# Altium footprint library BMS_V2.1_Adv.PcbLib: 66 footprints (part 3 of 5)
Each footprint in its own frame and in the unit in brackets; x right, y up, seen from the top. Pads: shape width x height; smd on the part's side, far side on the other; paste and mask are expansions set on the pad; w line width, h text height; cw(c..) or ccw(c..) is an arc to the next point about the centre after c.
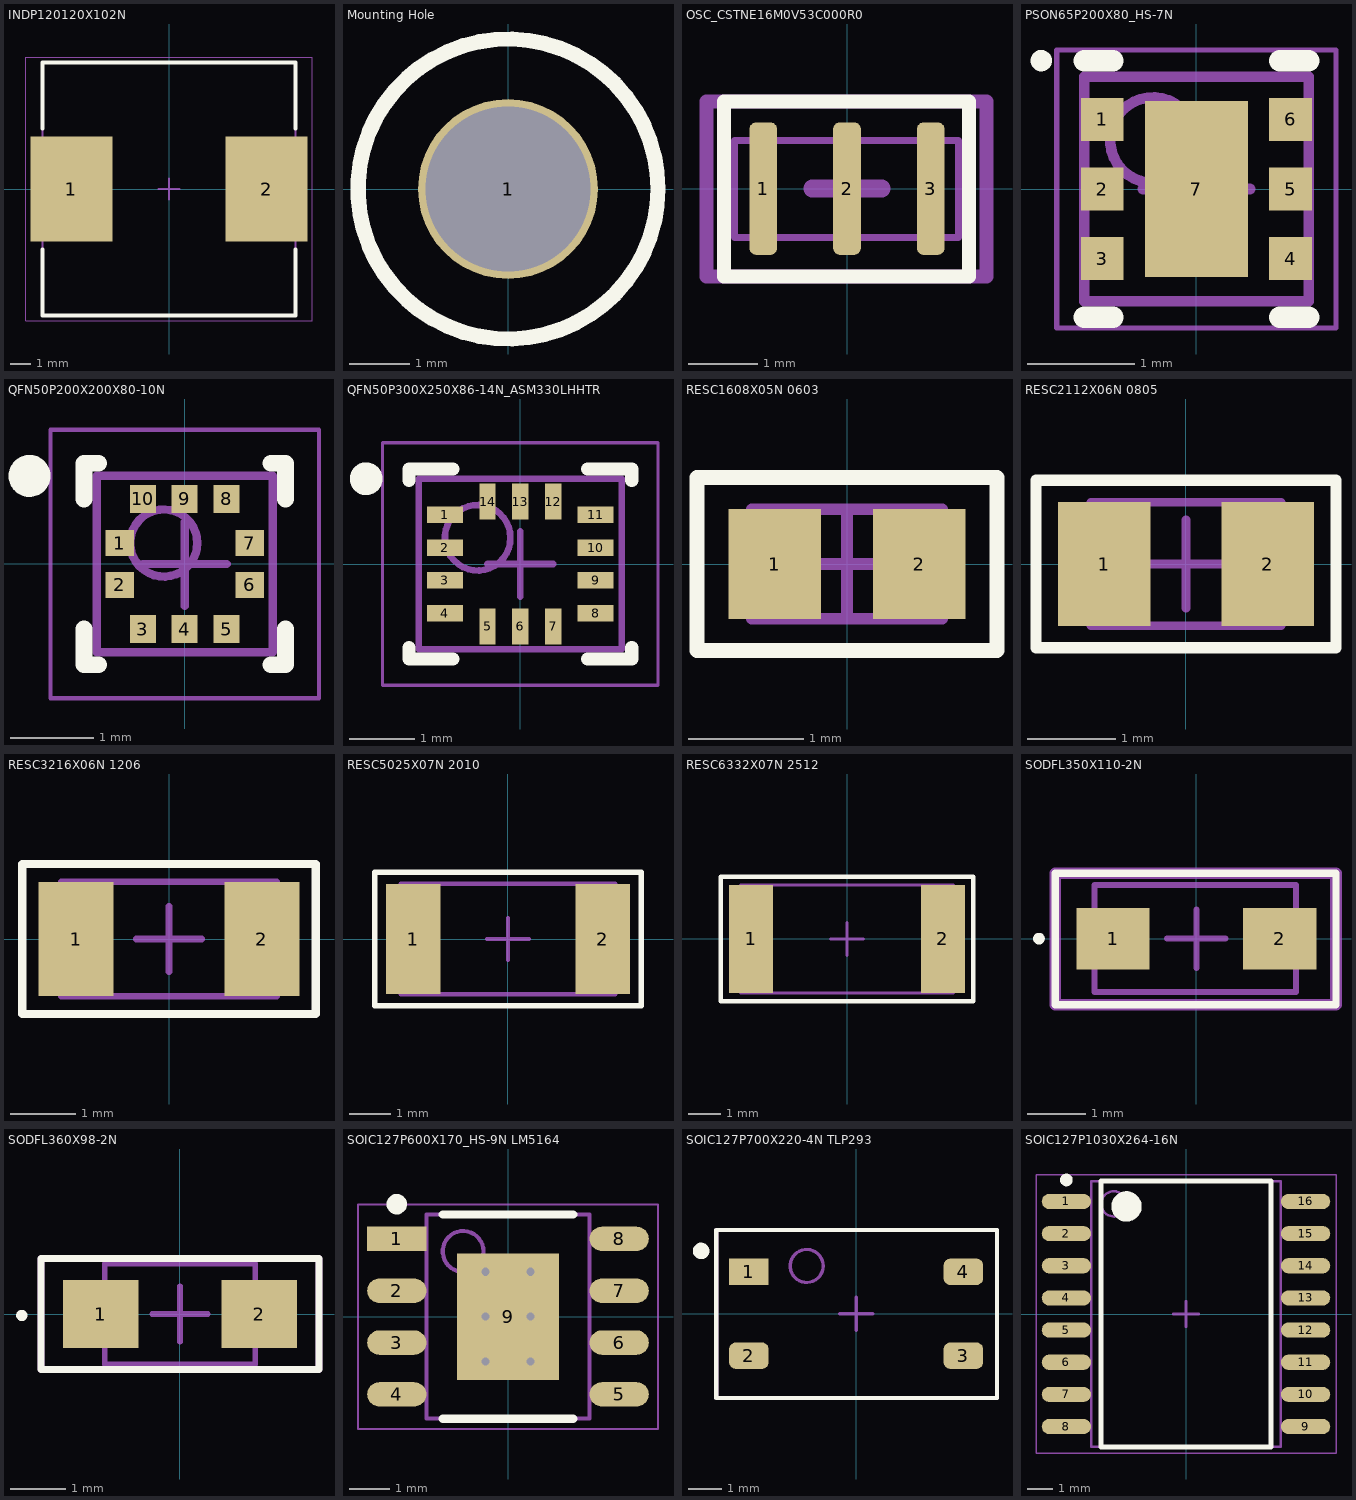
[diagram p2: the footprints below, top view; thin cyan lines are the x and y axes]

## INDP120120X102N [mm] "Precision Wire Wound Inductor, 2-Leads, Body 12.00x12.00mm, IPC Medium Density"
height 10.2
pads (2):
  rect 4x5.1 smd: 1(-4.75,0) 2(4.75,0)
Top Overlay:
  lines w0.2: -6.15,-2.95 -6.15,-6.15 6.15,-6.15 6.15,-2.95 ; -6.15,2.95 -6.15,6.15 6.15,6.15 6.15,2.95
Mechanical 13:
  lines w0.1: -6.15,-6.15 -6.15,6.15 6.15,6.15 6.15,-6.15 -6.15,-6.15
  text ".Designator" at -3.302,-0.254 h0.69
Mechanical 15:
  lines w0.05: -6.975,-6.4 -6.975,6.4 6.975,6.4 6.975,-6.4 -6.975,-6.4
  lines w0.1: -0.5,0 0.5,0 ; 0,-0.5 0,0.5
3D body "IND_MSS1210_COC.step": height 10.21, standoff 0, extent -6.147,-6.147 6.147,6.147

## Mounting Hole [mm] "Mounting Hole  M6"
pads (1):
  round 3 hole 2.75: 1(0,0)
Top Overlay:
  circle w0.254: c0,0 r2.5
Mechanical 13:
  text ".Designator" at -3.302,3.023 h0.69
Mechanical 15:
  lines w0.254: -0.5,0 0.5,0 ; 0,-0.5 0,0.5
3D body "MBScrew_Threaded.step": height 6.38, standoff 0.01, extent -3.4,-3.397 3.4,3.397
3D body "Standoff_M3_14mm.step": height 20.01, standoff 0.01, extent -2.35,-2.714 2.35,2.714

## OSC_CSTNE16M0V53C000R0 [mm] "CSTNE16M0V53C000R0"
height 1
pads (3):
  rrect50% 0.4x1.9 smd: 1(-1.2,0) 2(0,0) 3(1.2,0)
Top Overlay:
  lines w0.203: -1.763,-1.263 1.75,-1.263 1.75,1.25 -1.763,1.25 -1.763,-1.263
Mechanical 13:
  lines w0.1: -1.613,-0.699 1.6,-0.699 1.6,0.686 -1.613,0.686 -1.613,-0.699
  text ".Designator" at -1.27,0.102 h0.69
Mechanical 15:
  lines w0.203: -2.013,-1.263 2,-1.263 2,1.25 -2.013,1.25 -2.013,-1.263
  lines w0.254: -0.5,0 0.5,0 ; 0,-0.5 0,0.5
3D body "CSTNE16M0V53C000R0.step": height 1.01, standoff 0.01, extent -1.6,-0.65 1.6,0.65

## PSON65P200X80_HS-7N [mm] "PSON, 6-Leads, Body 2.00x2.00mm, Pitch 0.65mm, Thermal Pad 1.65x0.96mm, IPC Medium Density"
height 0.8
pads (7):
  rect 0.4x0.4 smd: 1(-0.88,0.65) 2(-0.88,0) 3(-0.88,-0.65) 4(0.88,-0.65) 5(0.88,0) 6(0.88,0.65)
  rect 0.96x1.65 smd: 7(0,0)
Top Overlay:
  circle w0.1: c-1.45,1.2 r0.05
  lines w0.2: -1.05,-1.2 -0.78,-1.2 ; -1.05,1.2 -0.78,1.2 ; 0.78,-1.2 1.05,-1.2 ; 0.78,1.2 1.05,1.2
Mechanical 13:
  circle w0.1: c-0.406,0.457 r0.4
  lines w0.1: -1.05,-1.05 1.05,-1.05 1.05,1.05 -1.05,1.05 -1.05,-1.05
  text ".Designator" at -0.508,-0.025 h0.69
Mechanical 15:
  lines w0.05: -1.305,-1.3 1.305,-1.3 1.305,1.3 -1.305,1.3 -1.305,-1.3
  lines w0.1: -0.5,0 0.5,0 ; 0,-0.5 0,0.5
3D body "TPS7A2633DRVR.step": height 0.81, standoff 0.01, extent -1,-1 1,1

## QFN50P200X200X80-10N [mm] "QFN, 10-Leads, Body 2.00x2.00mm, Pitch 0.50mm, IPC Medium Density"
height 0.8
pads (10):
  rect 0.335x0.31 smd: 1(-0.775,0.25) 2(-0.775,-0.25) 6(0.775,-0.25) 7(0.775,0.25)
  rect 0.31x0.335 smd: 3(-0.5,-0.775) 4(0,-0.775) 5(0.5,-0.775) 8(0.5,0.775) 9(0,0.775) 10(-0.5,0.775)
Top Overlay:
  circle w0.25: c-1.85,1.05 r0.125
  lines w0.2: -1.2,-0.775 -1.2,-1.2 -1.025,-1.2 ; -1.2,0.775 -1.2,1.2 -1.025,1.2 ; 1.025,-1.2 1.2,-1.2 1.2,-0.775 ; 1.025,1.2 1.2,1.2 1.2,0.775
Mechanical 13:
  circle w0.1: c-0.25,0.25 r0.4
  lines w0.1: -1.05,-1.05 -1.05,1.05 1.05,1.05 1.05,-1.05 -1.05,-1.05
Mechanical 15:
  lines w0.05: -1.6,-1.6 -1.6,1.6 1.6,1.6 1.6,-1.6 -1.6,-1.6
  lines w0.1: -0.5,0 0.5,0 ; 0,-0.5 0,0.5
3D body "HLGA_10L_STM.step": height 0.81, standoff 0, extent -1.054,-1.054 1.054,1.054

## QFN50P300X250X86-14N_ASM330LHHTR [mm] "QFN, 14-Leads, Body 3.00x2.50mm, Pitch 0.50mm, IPC Medium Density"
height 0.86
pads (14):
  rect 0.55x0.25 smd: 1(-1.15,0.75) 2(-1.15,0.25) 3(-1.15,-0.25) 4(-1.15,-0.75) 8(1.15,-0.75) 9(1.15,-0.25) 10(1.15,0.25) 11(1.15,0.75)
  rect 0.25x0.55 smd: 5(-0.5,-0.95) 6(0,-0.95) 7(0.5,-0.95) 12(0.5,0.95) 13(0,0.95) 14(-0.5,0.95)
Top Overlay:
  circle w0.25: c-2.35,1.3 r0.125
  lines w0.2: -1.7,-1.275 -1.7,-1.45 -1.025,-1.45 ; -1.7,1.275 -1.7,1.45 -1.025,1.45 ; 1.025,-1.45 1.7,-1.45 1.7,-1.275 ; 1.025,1.45 1.7,1.45 1.7,1.275
Mechanical 13:
  circle w0.1: c-0.65,0.4 r0.5
  lines w0.1: -1.55,-1.3 1.55,-1.3 1.55,1.3 -1.55,1.3 -1.55,-1.3
Mechanical 15:
  lines w0.05: -2.1,-1.85 2.1,-1.85 2.1,1.85 -2.1,1.85 -2.1,-1.85
  lines w0.1: -0.5,0 0.5,0 ; 0,-0.5 0,0.5
3D body "ASM330LHHTR.step": height 0.87, standoff 0.01, extent -1.5,-1.25 1.5,1.25

## RESC1608X05N 0603 [mm] "Chip Resistor, 2-Leads, Body 1.55x0.85mm, IPC Medium Density"
height 0.5
pads (2):
  rect 0.8x0.95 smd: 1(-0.625,0) 2(0.625,0)
Top Overlay:
  lines w0.127: -1.3,-0.75 1.3,-0.75 1.3,0.75 -1.3,0.75 -1.3,-0.75
Mechanical 13:
  lines w0.1: -0.825,-0.475 0.825,-0.475 0.825,0.475 -0.825,0.475 -0.825,-0.475
  text ".Designator" at -0.825,-0.475 h0.69
Mechanical 15:
  lines w0.05: -1.3,-0.75 -1.3,0.75 1.3,0.75 1.3,-0.75 -1.3,-0.75
  lines w0.1: -0.475,0 0.475,0 ; 0,-0.475 0,0.475
3D body "RESC1508X05N 0603.step": height 0.5, standoff 0, extent -0.825,-0.475 0.825,0.475

## RESC2112X06N 0805 [mm] "Chip Resistor, 2-Leads, Body 2.08x1.25mm, IPC Medium Density"
height 0.65
pads (2):
  rect 1.05x1.4 smd: 1(-0.925,0) 2(0.925,0)
Top Overlay:
  lines w0.127: -1.7,-0.95 1.7,-0.95 1.7,0.95 -1.7,0.95 -1.7,-0.95
Mechanical 13:
  lines w0.1: -1.075,-0.7 1.075,-0.7 1.075,0.7 -1.075,0.7 -1.075,-0.7
  text ".Designator" at -1.143,-0.508 h0.69
Mechanical 15:
  lines w0.05: -1.7,-0.95 -1.7,0.95 1.7,0.95 1.7,-0.95 -1.7,-0.95
  lines w0.1: -0.5,0 0.5,0 ; 0,-0.5 0,0.5
3D body "RES 0805.stp": height 0.55, standoff 0, extent -1,-0.635 1,0.615

## RESC3216X06N 1206 [mm] "Chip Resistor, 2-Leads, Body 3.15x1.60mm, IPC Medium Density"
height 0.6
pads (2):
  rect 1.15x1.75 smd: 1(-1.425,0) 2(1.425,0)
Top Overlay:
  lines w0.127: -2.25,-1.15 2.25,-1.15 2.25,1.15 -2.25,1.15 -2.25,-1.15
Mechanical 13:
  lines w0.1: -1.65,-0.875 1.65,-0.875 1.65,0.875 -1.65,0.875 -1.65,-0.875
  text ".Designator" at -1.397,-0.381 h0.69
Mechanical 15:
  lines w0.05: -2.25,-1.15 2.25,-1.15 2.25,1.15 -2.25,1.15 -2.25,-1.15
  lines w0.1: -0.5,0 0.5,0 ; 0,-0.5 0,0.5
3D body "RES 1206.step": height 0.61, standoff 0.01, extent -1.6,-0.8 1.6,0.8

## RESC5025X07N 2010 [mm] "Chip Resistor, 2-Leads, Body 5.00x2.50mm, IPC Medium Density"
height 0.7
pads (2):
  rect 1.3x2.65 smd: 1(-2.275,0) 2(2.275,0)
Top Overlay:
  lines w0.127: -3.2,-1.6 3.2,-1.6 3.2,1.6 -3.2,1.6 -3.2,-1.6
Mechanical 13:
  lines w0.1: -2.575,-1.325 -2.575,1.325 2.575,1.325 2.575,-1.325 -2.575,-1.325
  text ".Designator" at -1.778,-0.254 h0.69
Mechanical 15:
  lines w0.05: -3.2,-1.6 -3.2,1.6 3.2,1.6 3.2,-1.6 -3.2,-1.6
  lines w0.1: -0.5,0 0.5,0 ; 0,-0.5 0,0.5
3D body "RES 2010.step": height 0.71, standoff 0.01, extent -2.5,-1.25 2.5,1.25

## RESC6332X07N 2512 [mm] "Chip Resistor, 2-Leads, Body 6.30x3.15mm, IPC Medium Density"
height 0.7
pads (2):
  rect 1.35x3.3 smd: 1(-2.925,0) 2(2.925,0)
Top Overlay:
  lines w0.127: -3.85,-1.9 3.85,-1.9 3.85,1.9 -3.85,1.9 -3.85,-1.9
Mechanical 13:
  lines w0.1: -3.25,-1.65 -3.25,1.65 3.25,1.65 3.25,-1.65 -3.25,-1.65
  text ".Designator" at -2.032,-0.254 h0.69
Mechanical 15:
  lines w0.05: -3.85,-1.9 -3.85,1.9 3.85,1.9 3.85,-1.9 -3.85,-1.9
  lines w0.1: -0.5,0 0.5,0 ; 0,-0.5 0,0.5
3D body "RES 2512.step": height 0.71, standoff 0.01, extent -3.125,-1.575 3.175,1.575

## SODFL350X110-2N [mm] "SODFL, 2-Leads, Body 1.65x3.50mm, IPC Medium Density"
height 1.1
pads (2):
  rect 1.25x1.05 smd: 1(-1.425,0) 2(1.425,0)
Top Overlay:
  circle w0.1: c-2.692,0 r0.05
  lines w0.127: -2.413,-1.13 2.388,-1.13 2.388,1.118 -2.413,1.118 -2.413,-1.13
Mechanical 13:
  lines w0.1: -1.74,-0.914 1.702,-0.914 1.702,0.914 -1.74,0.914 -1.74,-0.914
  text ".Designator" at -1.397,-0.254 h0.69
Mechanical 15:
  lines w0.1: -0.5,0 0.5,0 ; 0,-0.5 0,0.5
  lines w0.203: -2.413,-1.13 2.388,-1.13 2.388,1.118 -2.413,1.118 -2.413,-1.13
3D body "SODFL350X110-2N.step": height 1.1, standoff 0, extent -1.75,-0.9 1.75,0.9

## SODFL360X98-2N [mm] "SODFL, 2-Leads, Body 1.65x3.60mm, IPC Medium Density"
height 0.98
pads (2):
  rect 1.35x1.22 smd: 1(-1.425,0) 2(1.425,0)
Top Overlay:
  circle w0.1: c-2.845,-0.025 r0.05
  lines w0.127: -2.5,-1 2.5,-1 2.5,1 -2.5,1 -2.5,-1
Mechanical 13:
  lines w0.1: -1.35,-0.9 1.35,-0.9 1.35,0.9 -1.35,0.9 -1.35,-0.9
  text ".Designator" at -1.422,-0.279 h0.69
Mechanical 15:
  lines w0.1: -0.5,0 0.5,0 ; 0,-0.5 0,0.5
  lines w0.127: -2.5,-1 2.5,-1 2.5,1 -2.5,1 -2.5,-1
3D body "SDO_SOD-123FL_498__OSI.step": height 1, standoff 0, extent -1.905,-0.889 1.905,0.915

## SOIC127P600X170_HS-9N LM5164 [mm] "SOIC, 8-Leads, Body 4.90x3.90mm, Pitch 1.27mm, Thermal Pad 3.10x2.50mm, IPC Medium Density"
height 1.7
pads (9):
  rect 1.45x0.6 smd: 1(-2.725,1.905)
  oval 1.45x0.6 smd: 2(-2.725,0.635) 3(-2.725,-0.635) 4(-2.725,-1.905) 5(2.725,-1.905) 6(2.725,-0.635) 7(2.725,0.635) 8(2.725,1.905)
  rect 2.5x3.1 smd: 9(0,0)
via 0.55,-1.1 diameter 0.5 hole 0.2
via -0.55,-1.1 diameter 0.5 hole 0.2
via 0.55,0 diameter 0.5 hole 0.2
via -0.55,0 diameter 0.5 hole 0.2
via 0.55,1.1 diameter 0.5 hole 0.2
via -0.55,1.1 diameter 0.5 hole 0.2
Top Overlay:
  circle w0.25: c-2.725,2.755 r0.125
  lines w0.2: -1.6,-2.5 1.6,-2.5 ; -1.6,2.5 1.6,2.5
Mechanical 13:
  circle w0.1: c-1.1,1.6 r0.5
  lines w0.1: -2,-2.5 2,-2.5 2,2.5 -2,2.5 -2,-2.5
  text ".Designator" at -1.524,-0.127 h0.69
Mechanical 15:
  lines w0.05: -3.675,-2.75 3.675,-2.75 3.675,2.75 -3.675,2.75 -3.675,-2.75
  lines w0.1: -0.5,0 0.5,0 ; 0,-0.5 0,0.5
3D body "LM5164DDAT.step": height 1.56, standoff -0.14, extent -3,-2.45 3,2.45

## SOIC127P700X220-4N TLP293 [mm] "SOIC, 4-Leads, Body 2.65x4.60mm, Pitch 1.27mm, IPC Medium Density"
height 2.2
pads (4):
  rect 1.2x0.8 smd: 1(-3.25,1.27)
  rrect50% 1.2x0.8 smd: 2(-3.25,-1.27) 3(3.25,-1.27) 4(3.25,1.27)
Top Overlay:
  circle w0.25: c-4.699,1.905 r0.125
  lines w0.127: -4.243,-2.553 4.267,-2.553 4.267,2.54 -4.243,2.54 -4.243,-2.553
Mechanical 13:
  circle w0.1: c-1.5,1.45 r0.5
  lines w0.127: -4.243,-2.553 4.267,-2.553 4.267,2.54 -4.243,2.54 -4.243,-2.553
  text ".Designator" at -3.607,2.565 h0.69
Mechanical 15:
  lines w0.1: -0.5,0 0.5,0 ; 0,-0.5 0,0.5
  lines w0.127: -4.243,-2.553 4.267,-2.553 4.267,2.54 -4.243,2.54 -4.243,-2.553
3D body "SOP-4V2.STEP": height 2.13, standoff -0.04, extent -3.475,-2.46 3.475,2.46

## SOIC127P1030X264-16N [mm] "SOIC, 16-Leads, Body 10.65x7.44mm, Pitch 1.27mm, IPC Medium Density"
height 2.64
pads (16):
  oval 1.95x0.6 smd: 1(-4.725,4.445) 2(-4.725,3.175) 3(-4.725,1.905) 4(-4.725,0.635) 5(-4.725,-0.635) 6(-4.725,-1.905) 7(-4.725,-3.175) 8(-4.725,-4.445) 9(4.725,-4.445) 10(4.725,-3.175) 11(4.725,-1.905) 12(4.725,-0.635) 13(4.725,0.635) 14(4.725,1.905) 15(4.725,3.175) 16(4.725,4.445)
Top Overlay:
  circle w0.25: c-4.725,5.295 r0.125
  circle w0.6: c-2.35,4.25 r0.3
  lines w0.2: -3.35,-5.25 -3.35,5.25 3.35,5.25 3.35,-5.25 -3.35,-5.25
Mechanical 13:
  circle w0.1: c-2.85,4.35 r0.5
  lines w0.1: -3.75,-5.25 -3.75,5.25 3.75,5.25 3.75,-5.25 -3.75,-5.25
  text ".Designator" at -1.524,0 h0.69
Mechanical 15:
  lines w0.05: -5.925,-5.5 -5.925,5.5 5.925,5.5 5.925,-5.5 -5.925,-5.5
  lines w0.1: -0.5,0 0.5,0 ; 0,-0.5 0,0.5
3D body "SOIC127P1030X264-16N.step": height 2.64, standoff 0, extent -5.162,-5.25 5.162,5.25